# Altium schematic symbol library Electronic Devices_LIB.SchLib: 703 symbols (part 3 of 8)
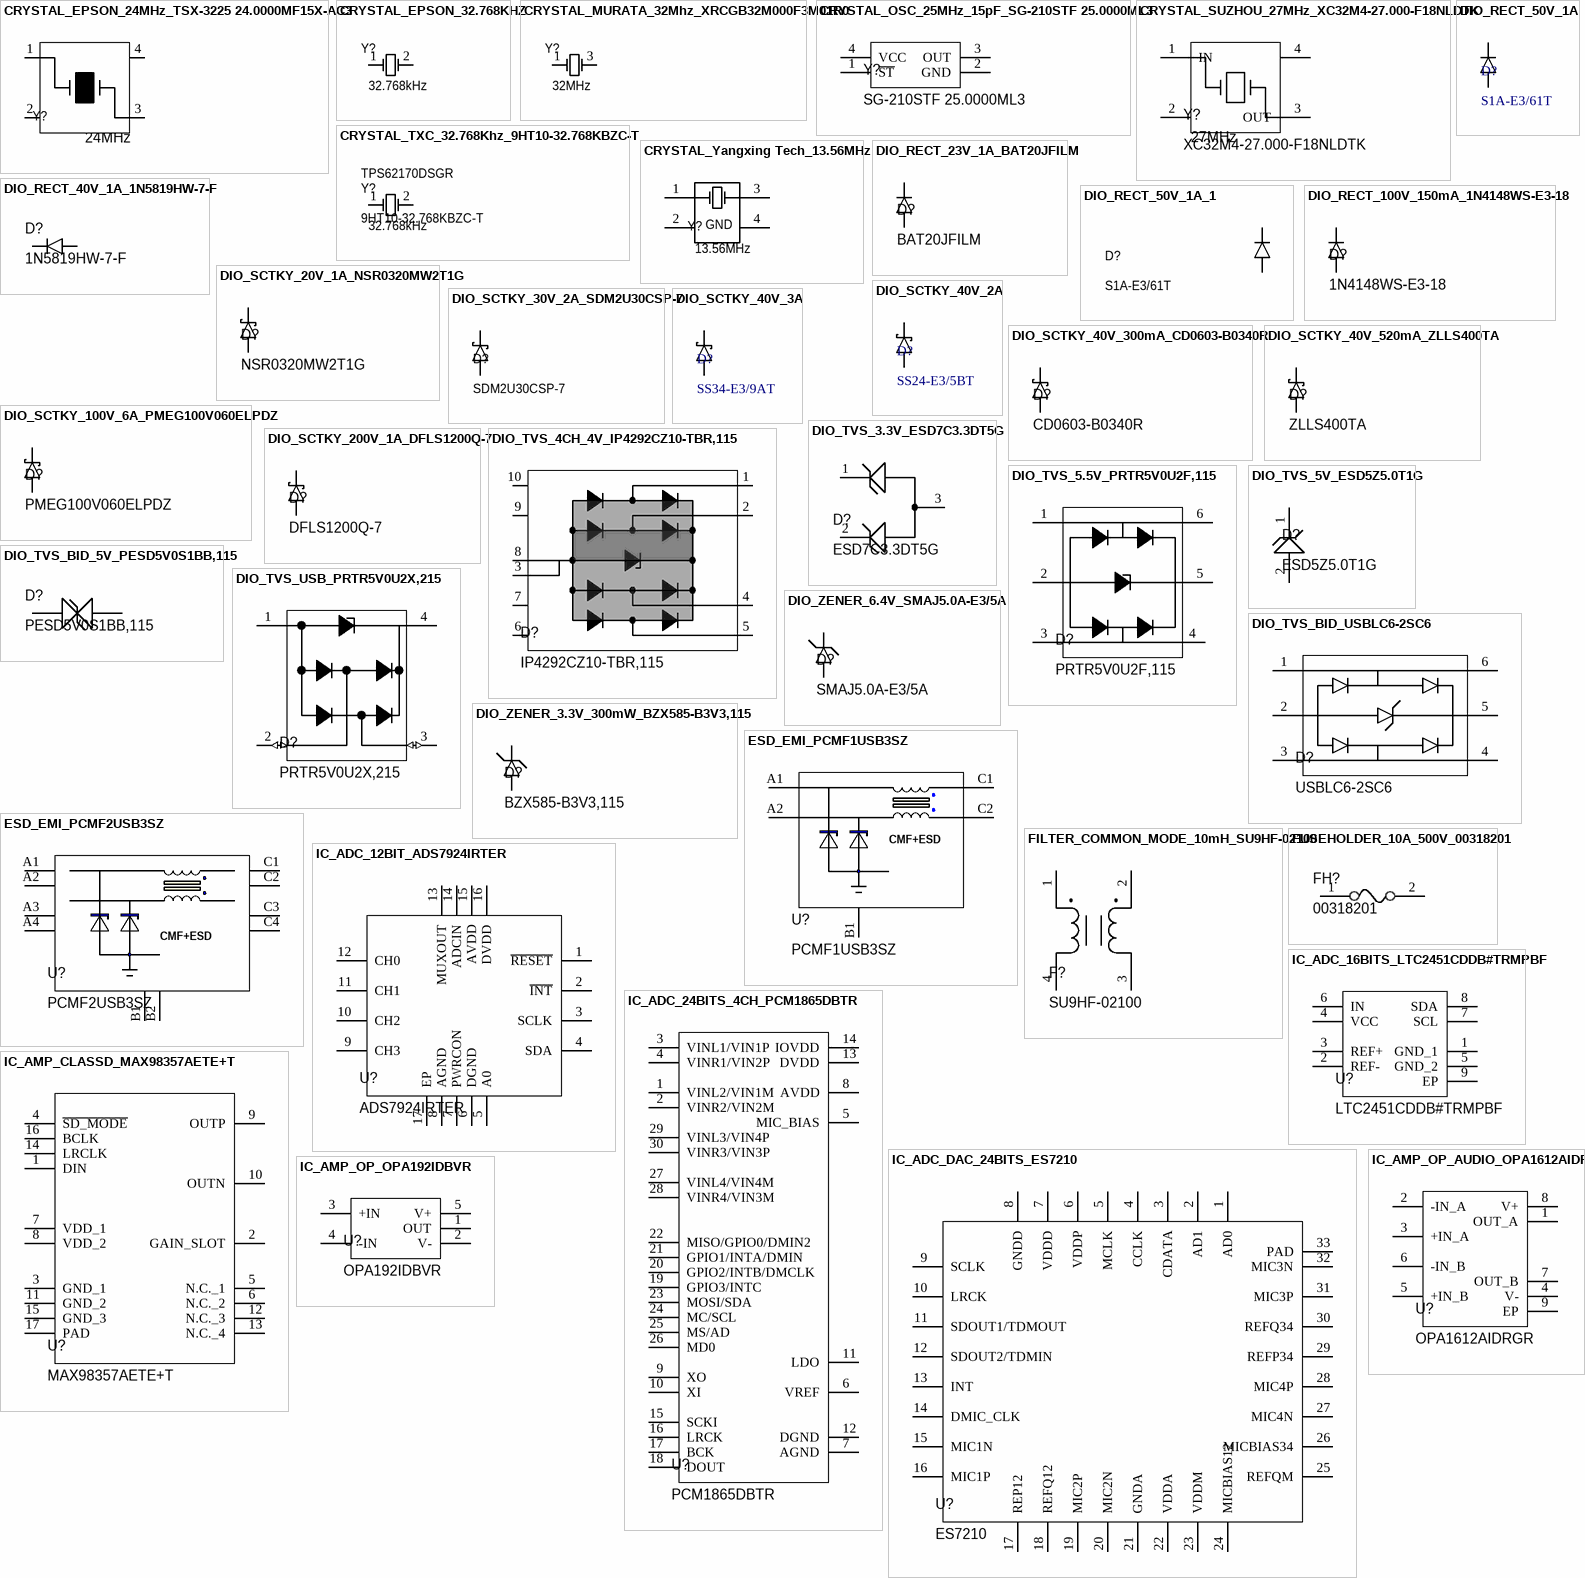
[diagram p38: symbols CRYSTAL_EPSON_24MHz_TSX-3225 24.0000MF15X-AC3 to IC_AMP_OP_OPA192IDBVR]

## IC_AMP_OP_AUDIO_OPA1612AIDRGR
designator U?, comment OPA1612AIDRGR
SoundPlus Audio Operational Amplifier with 1.1nV/√Hz Noise, Low THD and Precision 8-SON -40 to 85; Manufacturer: Texas Instruments; Slew Rate: 27V/µs; Number of Circuits: 2; Gain Bandwidth Product: 40MHz; Input Bias Current: 60nA; Input Offset Voltage (Vos): 100uV; Operating Supply Current: 3.6mA; Output Current per Channel: 55mA; Input Voltage Noise Density: 1.1nV/sqrt Hz; Supplier 1: Digi-Key; Manufacturer Part Number: OPA1612AIDRGR; RoHS: Yes; Category: Amplifiers - Op Amps, Buffer, Instrumentation; Stock 1: 1990; Pricing 1: 1=6.4, 10=5.781, 25=5.5116, 100=4.7857, 250=4.57064, 500=4.16736, 1000=3.62964 (USD); Mount: Surface Mount; Case/Package: SON; Number of Pins: 8; Min Operating Temperature: -40°C; Max Operating Temperature: 85°C; Packaging: Cut Tape; Number of Amplifiers: 2; Package Quantity: 3000; Bandwidth: 40MHz; Number of Channels: 2; Series: SoundPlus™; Reach SVHC Compliant: No; Lead Free: Lead Free; RoHS Compliant: Yes; ComponentLink1URL: https://datasheet.ciiva.com/46439/1850565-46439707.pdf?src-supplier=Element14; ComponentLink1Description: https://datasheet.ciiva.com/46439/1850565-46439707.pdf?src-supplier=Element14; Supplier Part Number 1: 296-38367-1-ND
footprint IC_AMP_OP_SON50P300X300X80-9N-D (8-WFDFN Exposed Pad)
pins: 1 OUT_A, 2 -IN_A, 3 +IN_A, 4 V-, 5 +IN_B, 6 -IN_B, 7 OUT_B, 8 V+, 9 EP

## IC_AMP_OP_OPA192IDBVR
designator U?, comment OPA192IDBVR
General Purpose Amplifier 1 Circuit Rail-to-Rail SOT-23-5; Manufacturer: Texas Instruments; Slew Rate: 20V/µs; Max Supply Voltage: 36V; Min Supply Voltage: 4.5V; Number of Circuits: 1; Gain Bandwidth Product: 10MHz; Input Bias Current: 5pA; Input Offset Voltage (Vos): 5uV; Operating Supply Current: 1mA; Output Current per Channel: 65mA; Supplier 1: Heisener; Manufacturer Part Number: OPA192IDBVR; RoHS: Yes; Category: Amplifiers - Op Amps, Buffer, Instrumentation; Stock 1: 9223; Pricing 1: 1=3.0322 (USD); Case/Package: SOT-23-5; Number of Pins: 5; Min Operating Temperature: -40°C; Max Operating Temperature: 125°C; Packaging: Tape and Reel; Bandwidth: 10MHz; Number of Amplifiers: 1; Number of Channels: 1; Series: e-trim™; Amplifier Type: GENERAL PURPOSE; Reach SVHC Compliant: No; Lead Free: Lead Free; RoHS Compliant: Yes; ComponentLink1URL: http://www.ti.com/general/docs/lit/getliterature.tsp?genericPartNumber=OPA192&&fileType=pdf&src-supplier=Element14; ComponentLink1Description: http://www.ti.com/general/docs/lit/getliterature.tsp?genericPartNumber=OPA192&&fileType=pdf&src-supplier=Element14; ComponentLink2URL: http://www.ti.com/general/docs/lit/getliterature.tsp?genericPartNumber=OPA192&amp;&amp;fileType=pdf&src-supplier=Element14; ComponentLink2Description: http://www.ti.com/general/docs/lit/getliterature.tsp?genericPartNumber=OPA192&amp;&amp;fileType=pdf&src-supplier=Element14; ComponentLink3URL: http://www.ti.com/general/docs/lit/getliterature.tsp?genericPartNumber=OPA192&amp;&amp;fileType=pdf&src-supplier=Farnell; ComponentLink3Description: http://www.ti.com/general/docs/lit/getliterature.tsp?genericPartNumber=OPA192&amp;&amp;fileType=pdf&src-supplier=Farnell; ComponentLink4URL: http://www.ti.com/general/docs/lit/getliterature.tsp?genericPartNumber=OPA192&&fileType=pdf&src-supplier=Farnell; ComponentLink4Description: http://www.ti.com/general/docs/lit/getliterature.tsp?genericPartNumber=OPA192&&fileType=pdf&src-supplier=Farnell; ComponentLink5URL: http://www.ti.com/general/docs/lit/getliterature.tsp?genericPartNumber=OPA2192&&fileType=pdf&src-supplier=Avnet; ComponentLink5Description: http://www.ti.com/general/docs/lit/getliterature.tsp?genericPartNumber=OPA2192&&fileType=pdf&src-supplier=Avnet; ComponentLink6URL: http://www.ti.com/lit/gpn/opa192?src-supplier=Mouser; ComponentLink6Description: http://www.ti.com/lit/gpn/opa192?src-supplier=Mouser; ComponentLink7URL: http://www.ti.com/general/docs/lit/getliterature.tsp?genericPartNumber=OPA192&amp;&amp;fileType=pdf&src-supplier=Newark; ComponentLink7Description: http://www.ti.com/general/docs/lit/getliterature.tsp?genericPartNumber=OPA192&amp;&amp;fileType=pdf&src-supplier=Newark; ComponentLink8URL: http://www.ti.com/lit/ds/symlink/opa192.pdf?src-supplier=Digi-Key; ComponentLink8Description: http://www.ti.com/lit/ds/symlink/opa192.pdf?src-supplier=Digi-Key; Supplier Part Number 1: OPA192IDBVR
footprint IC_AMP_OP_SOT95P280X145-5N (SOT-23-5)
pins: 1 OUT, 2 V- (power), 3 +IN, 4 -IN, 5 V+ (power)

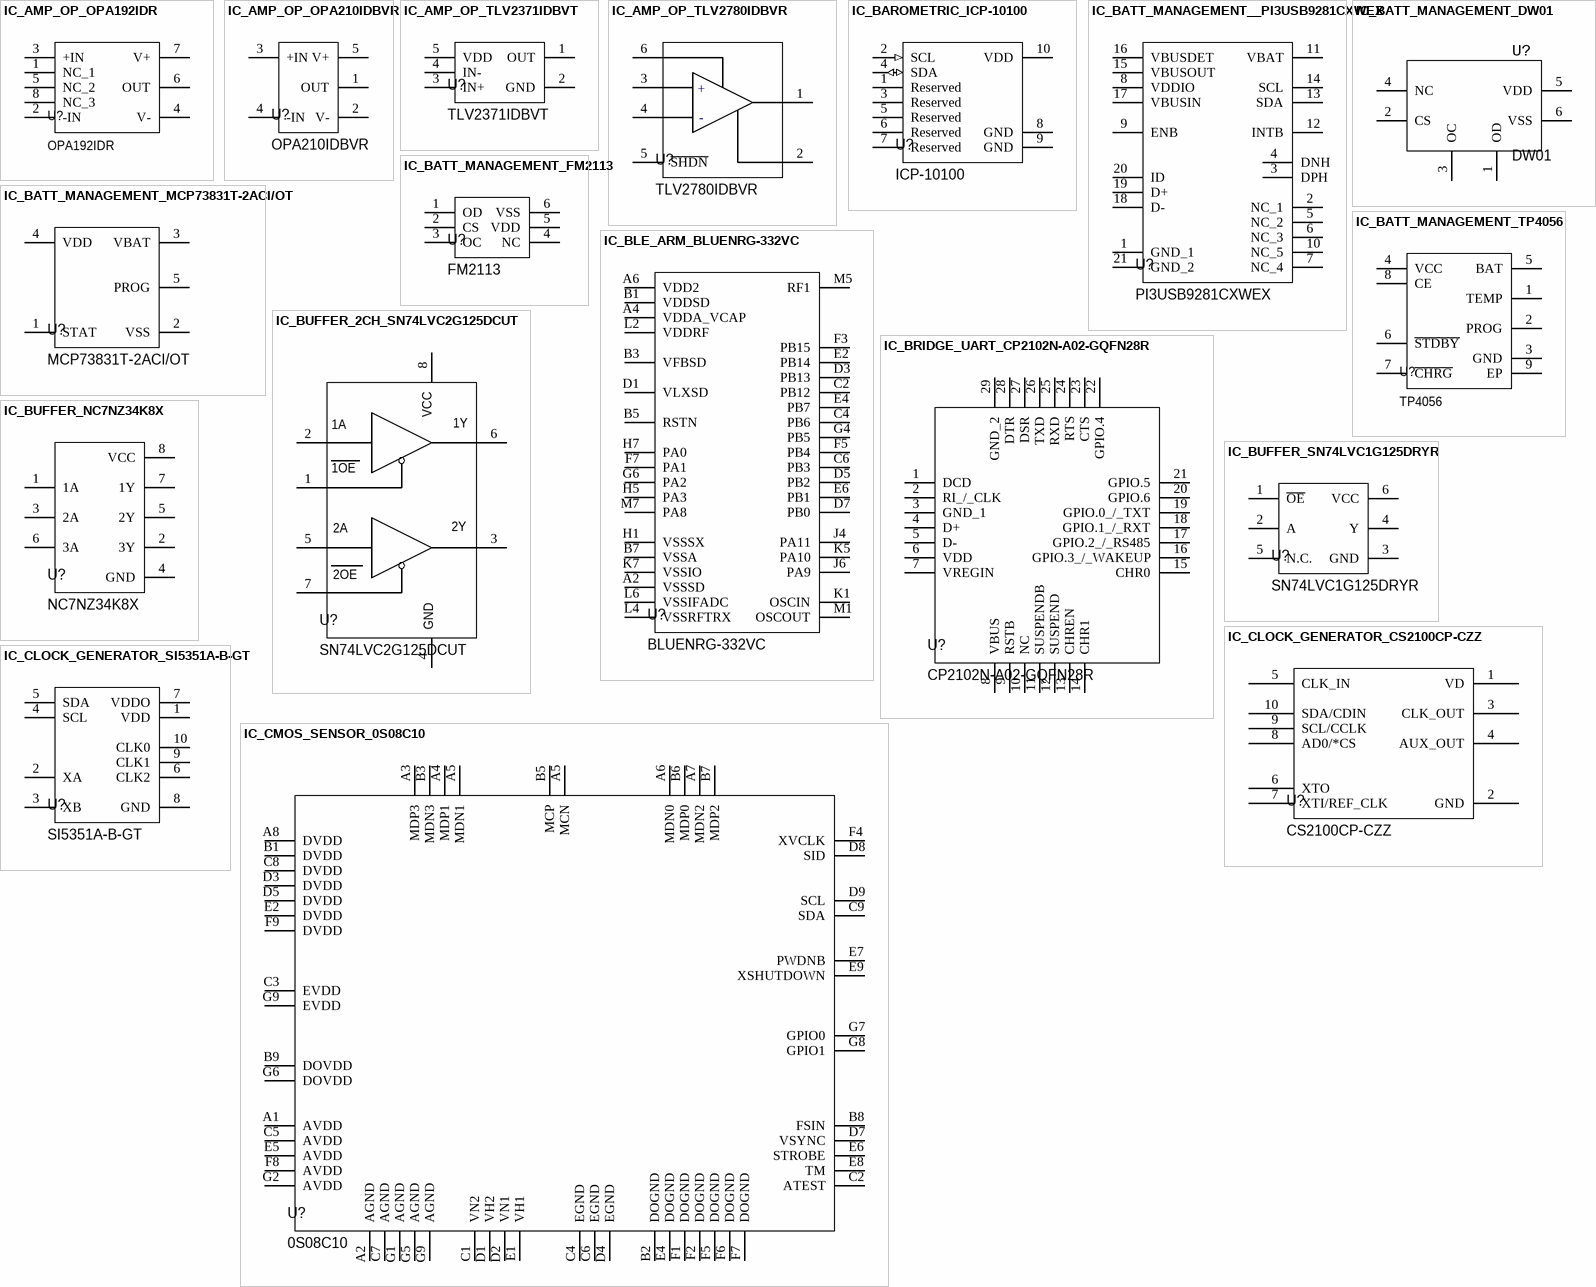
[diagram p7: symbols IC_AMP_OP_OPA192IDR to IC_CMOS_SENSOR_0S08C10]

## IC_AMP_OP_OPA192IDR
designator U?, comment OPA192IDR
IC OPAMP GP 10MHZ RRO 8SOIC; Manufacturer: Texas Instruments; Min Dual Supply Voltage: 2.25V; Max Dual Supply Voltage: 18V; Voltage Gain: 140dB; Slew Rate: 20V/µs; Max Supply Voltage: 36V; Min Supply Voltage: 4.5V; Number of Circuits: 1; Input Bias Current: 5pA; Input Offset Voltage (Vos): 5uV; Operating Supply Current: 1mA; Output Current per Channel: 65mA; Common Mode Rejection Ratio: 100dB; Amplifier Type: GENERAL PURPOSE; Supplier 1: Mouser; Manufacturer Part Number: OPA192IDR; RoHS: Yes; Category: Amplifiers - Op Amps, Buffer, Instrumentation; Stock 1: 7595; Pricing 1: 1=3.14, 10=2.67, 50=2.67, 100=2.31, 250=2.19, 500=1.96, 1000=1.66, 2500=1.56, 5000=1.51, 10000=1.51 (USD); Case/Package: SOIC; Number of Pins: 8; Min Operating Temperature: -40°C; Max Operating Temperature: 125°C; Package Quantity: 2500; Packaging: Tape and Reel; Gain Bandwidth Product: 10MHz; Bandwidth: 10MHz; Number of Amplifiers: 1; Number of Channels: 1; Series: e-trim™; Reach SVHC Compliant: No; Lead Free: Lead Free; RoHS Compliant: Yes; ComponentLink1URL: https://datasheet.ciiva.com/29638/opa192-29638101.pdf?src-supplier=Digi-Key; ComponentLink1Description: https://datasheet.ciiva.com/29638/opa192-29638101.pdf?src-supplier=Digi-Key; ComponentLink2URL: https://datasheet.ciiva.com/29638/opa192-29638102.pdf?src-supplier=Digi-Key; ComponentLink2Description: https://datasheet.ciiva.com/29638/opa192-29638102.pdf?src-supplier=Digi-Key; ComponentLink3URL: https://datasheet.ciiva.com/29638/opa192-29638103.pdf?src-supplier=Digi-Key; ComponentLink3Description: https://datasheet.ciiva.com/29638/opa192-29638103.pdf?src-supplier=Digi-Key; Supplier Part Number 1: 595-OPA192IDR
footprint IC_AMP_OP_SOIC127P600X175-8N (8-SOIC (0.154", 3.90mm Width))
pins: 1 NC_1, 2 -IN, 3 +IN, 4 V-, 5 NC_2, 6 OUT, 7 V+, 8 NC_3

## IC_AMP_OP_OPA210IDBVR
designator U?, comment OPA210IDBVR
2.2-nV/√Hz, low-power, 36-V operational amplifier 5-SOT-23 -40 to 125; Manufacturer: Texas Instruments; Supplier 1: Digi-Key; Manufacturer Part Number: OPA210IDBVR; RoHS: No; Category: Amplifiers - Op Amps, Buffer, Instrumentation; Stock 1: 11070; Pricing 1: 1=3.09, 10=2.776, 25=2.6248, 100=2.2748, 250=2.15812, 500=1.93648, 1000=1.63317 (USD); Supplier Part Number 1: 296-OPA210IDBVRCT-ND
footprint IC_SOT-23-5_SOT95P280X145-5N (SC-74A, SOT-753)
pins: 1 OUT, 2 V-, 3 +IN, 4 -IN, 5 V+

## IC_AMP_OP_TLV2371IDBVT
designator U?, comment TLV2371IDBVT
Single 550-uA/channel, 3MHz, RRIO op amp 5-SOT-23 -40 to 125; Manufacturer: Texas Instruments; Max Supply Voltage: 16V; Min Supply Voltage: 2.7V; Min Dual Supply Voltage: 1.35V; Max Dual Supply Voltage: 8V; Voltage Gain: 110dB; Common Mode Rejection Ratio: 50dB; Output Current: 16mA; Number of Channels: 1; Slew Rate: 2.4V/µs; Max I/O Voltage: 4.5mV; Input Bias Current: 60pA; Operating Supply Current: 750uA; Power Dissipation: 385mW; Power Supply Rejection Ratio (PSRR): 70dB; Amplifier Type: GENERAL PURPOSE; Supply Current: 900uA; Dual Supply Voltage: 5V; Supplier 1: Digikey; Manufacturer Part Number: TLV2371IDBVT; RoHS: Yes; Category: Amplifiers - Op Amps, Buffer, Instrumentation; Stock 1: 25753; Pricing 1: 1=1.65, 10=1.483, 25=1.3988, 100=1.1918 (USD); Case/Package: SOT-23; Number of Pins: 5; Min Operating Temperature: -40°C; Max Operating Temperature: 125°C; Gain Bandwidth Product: 3MHz; Unity Gain Bandwidth Product: 3MHz; Packaging: Tape and Reel; Bandwidth: 3MHz; Operating Supply Voltage: 8V; Package Quantity: 1; Nominal Gain Bandwidth Product: 3MHz; Number of Circuits: 1; Input Offset Voltage (Vos): 4.5mV; Output Current per Channel: 16mA; Number of Elements: 1; Series: -; Number of Amplifiers: 1; Length: 2.9mm; Width: 1.6mm; Height: 1.15mm; Radiation Hardening: No; Lead Free: Lead Free; RoHS Compliant: Yes; Reach SVHC Compliant: No; ComponentLink1URL: https://datasheet.ciiva.com/34301/1096243-34301979.pdf?src-supplier=Jameco; ComponentLink1Description: https://datasheet.ciiva.com/34301/1096243-34301979.pdf?src-supplier=Jameco; ComponentLink2URL: https://datasheet.ciiva.com/1813/tlv2370-1813657.pdf?src-supplier=Digikey; ComponentLink2Description: https://datasheet.ciiva.com/1813/tlv2370-1813657.pdf?src-supplier=Digikey; ComponentLink3URL: https://datasheet.ciiva.com/1813/tlv2370-1813658.pdf?src-supplier=Digikey; ComponentLink3Description: https://datasheet.ciiva.com/1813/tlv2370-1813658.pdf?src-supplier=Digikey; ComponentLink4URL: https://datasheet.ciiva.com/1813/tlv2370-1813659.pdf?src-supplier=Digikey; ComponentLink4Description: https://datasheet.ciiva.com/1813/tlv2370-1813659.pdf?src-supplier=Digikey; ComponentLink5URL: https://datasheet.ciiva.com/2974/slos270d-2974406.pdf?src-supplier=Avnet; ComponentLink5Description: https://datasheet.ciiva.com/2974/slos270d-2974406.pdf?src-supplier=Avnet; ComponentLink6URL: https://datasheet.ciiva.com/2974/slos270d-2974407.pdf?src-supplier=Avnet; ComponentLink6Description: https://datasheet.ciiva.com/2974/slos270d-2974407.pdf?src-supplier=Avnet; ComponentLink7URL: https://datasheet.ciiva.com/22707/1877122-22707949.pdf?src-supplier=Element14; ComponentLink7Description: https://datasheet.ciiva.com/22707/1877122-22707949.pdf?src-supplier=Element14; ComponentLink8URL: https://datasheet.ciiva.com/46386/1877122-46386527.pdf?src-supplier=Element14; ComponentLink8Description: https://datasheet.ciiva.com/46386/1877122-46386527.pdf?src-supplier=Element14; ComponentLink9URL: https://datasheet.ciiva.com/7848/1877122-7848285.pdf?src-supplier=Element14; ComponentLink9Description: https://datasheet.ciiva.com/7848/1877122-7848285.pdf?src-supplier=Element14; Supplier Part Number 1: 296-26785-6-ND
footprint IC_AMP_OP_SOT95P280X145-5N (SOT-23-5)
pins: 1 OUT, 2 GND (power), 3 IN+, 4 IN-, 5 VDD (power)

## IC_AMP_OP_TLV2780IDBVR
designator U?, comment TLV2780IDBVR
Op Amp Single High Speed Amplifier R-R I/O ±1.8V/3.6V 6-Pin SOT-23 T/R; Manufacturer: Texas Instruments; Unity Gain Bandwidth Product: 8MHz; Min Supply Voltage: 1.8V; Max Supply Voltage: 3.6V; Min Dual Supply Voltage: 900mV; Voltage Gain: 120dB; Output Current: 23mA; Common Mode Rejection Ratio: 50dB; Number of Channels: 1; Slew Rate: 4.3V/µs; Max I/O Voltage: 3mV; Input Bias Current: 15pA; Operating Supply Current: 650uA; Power Dissipation: 425mW; Supply Current: 770uA; Amplifier Type: GENERAL PURPOSE; Supplier 1: Mouser; Manufacturer Part Number: TLV2780IDBVR; RoHS: Yes; Category: Amplifiers - Op Amps, Buffer, Instrumentation; Stock 1: 4329; Pricing 1: 1=2.27, 10=1.95, 50=1.95, 100=1.68, 250=1.58, 500=1.48, 1000=1.23, 3000=1.14, 6000=1.07, 9000=1.05, 10000=1.07 (USD); Case/Package: SOT-23-6; Number of Pins: 6; Min Operating Temperature: -40°C; Max Operating Temperature: 125°C; Max Dual Supply Voltage: 1.8V; Packaging: Tape and Reel; Package Quantity: 1; Nominal Gain Bandwidth Product: 8MHz; Input Offset Voltage (Vos): 3mV; Gain Bandwidth Product: 8MHz; Number of Circuits: 1; Output Current per Channel: 23mA; Number of Elements: 1; Bandwidth: 8MHz; Series: -; Radiation Hardening: No; Lead Free: Lead Free; RoHS Compliant: Yes; ComponentLink1URL: https://datasheet.ciiva.com/1798/tlv2782a-1798923.pdf?src-supplier=Digikey; ComponentLink1Description: https://datasheet.ciiva.com/1798/tlv2782a-1798923.pdf?src-supplier=Digikey; ComponentLink2URL: https://datasheet.ciiva.com/1798/tlv2782a-1798924.pdf?src-supplier=Digikey; ComponentLink2Description: https://datasheet.ciiva.com/1798/tlv2782a-1798924.pdf?src-supplier=Digikey; ComponentLink3URL: https://datasheet.ciiva.com/1798/tlv2780-1798925.pdf?src-supplier=Digikey; ComponentLink3Description: https://datasheet.ciiva.com/1798/tlv2780-1798925.pdf?src-supplier=Digikey; ComponentLink4URL: https://datasheet.ciiva.com/14460/slos245e-14460553.pdf?src-supplier=Avnet; ComponentLink4Description: https://datasheet.ciiva.com/14460/slos245e-14460553.pdf?src-supplier=Avnet; ComponentLink5URL: https://datasheet.ciiva.com/48706/001072368-da-01-en-ic-opamp-gp-r-tlv2780idbvr-sot-23-6-tid-48706699.pdf?src-supplier=Conrad; ComponentLink5Description: https://datasheet.ciiva.com/48706/001072368-da-01-en-ic-opamp-gp-r-tlv2780idbvr-sot-23-6-tid-48706699.pdf?src-supplier=Conrad; Supplier Part Number 1: 595-TLV2780IDBVR
footprint Texas_Instruments_DBV0006A_IPC_A
pins: 1 OUT (hiz), 2 GND (power), 3 IN+ (hiz), 4 IN- (hiz), 5 ~{SHDN}, 6 VDD (power)

## IC_BAROMETRIC_ICP-10100
designator U?, comment ICP-10100
Barometric Pressure and Temperature Sensor Digital Output 1.8V 10-Pin LGA T/R; Manufacturer: TDK InvenSense; Output Type: I2C; Pressure Type: Differential; Operating Pressure: 15.95PSI; Port Style: No Port; Supplier 1: Digikey; Manufacturer Part Number: ICP-10100; RoHS: Yes; Category: Pressure Sensors; Stock 1: 17254; Pricing 1: 1=3.67, 10=2.75, 25=2.444, 50=2.322, 100=2.2609, 500=1.89426, 1000=1.77204, 5000=1.64984 (USD); Case/Package: LGA; Number of Pins: 10; Min Operating Temperature: -40°C; Max Operating Temperature: 85°C; Series: -; Packaging: Cut Tape; Termination: SMD/SMT; RoHS Compliant: Yes; ComponentLink1URL: http://www.farnell.com/datasheets/2632663.pdf?src-supplier=Farnell; ComponentLink1Description: http://www.farnell.com/datasheets/2632663.pdf?src-supplier=Farnell; ComponentLink2URL: http://www.invensense.com/wp-content/uploads/2018/01/DS-000186-ICP-101xx-v1.0.pdf?src-supplier=Digikey; ComponentLink2Description: http://www.invensense.com/wp-content/uploads/2018/01/DS-000186-ICP-101xx-v1.0.pdf?src-supplier=Digikey; ComponentLink3URL: http://www.invensense.com/wp-content/uploads/2018/01/DS-000186-ICP-101xx-v1.2.pdf?ref_disty=digikey&src-supplier=Digikey; ComponentLink3Description: http://www.invensense.com/wp-content/uploads/2018/01/DS-000186-ICP-101xx-v1.2.pdf?ref_disty=digikey&src-supplier=Digikey; Supplier Part Number 1: 1428-1135-1-ND
footprint IC_IMU_TDK_InvenSense_0_IPC_A (QFN 3.0x3.0x0.9)
pins: 1 Reserved, 2 SCL (in), 3 Reserved, 4 SDA (io), 5 Reserved, 6 Reserved, 7 Reserved, 8 GND (power), 9 GND (power), 10 VDD

## IC_BATT_MANAGEMENT__PI3USB9281CXWEX
designator U?, comment PI3USB9281CXWEX
Battery Charger Li-Ion 30mA 20-Pin UQFN EP T/R; Manufacturer: Diodes; Supplier 1: Digi-Key; Manufacturer Part Number: PI3USB9281CXWEX; RoHS: Yes; Category: Power Management ICs; Stock 1: 26042; Pricing 1: 1=1.64, 10=1.472, 25=1.3888, 100=1.1832, 250=1.111, 500=0.97212, 1000=0.80548, 2500=0.74992 (USD); Mount: Surface Mount; Min Operating Temperature: -40°C; Max Operating Temperature: 85°C; Packaging: Cut Tape; Series: -; RoHS Compliant: Yes; ComponentLink1URL: https://www.diodes.com/assets/Datasheets/PI3USB9281C.pdf?src-supplier=Digi-Key; ComponentLink1Description: https://www.diodes.com/assets/Datasheets/PI3USB9281C.pdf?src-supplier=Digi-Key; Supplier Part Number 1: PI3USB9281CXWEXDICT-ND
footprint IC_BATT_MANG_QFN50P300X400X55-21N-D (20-Lead UQFN)
pins: 1 GND_1, 2 NC_1, 3 DPH, 4 DNH, 5 NC_2, 6 NC_3, 7 NC_4, 8 VDDIO, 9 ENB, 10 NC_5, 11 VBAT, 12 INTB, 13 SDA, 14 SCL, 15 VBUSOUT, 16 VBUSDET, 17 VBUSIN, 18 D-, 19 D+, 20 ID, 21 GND_2

## IC_BATT_MANAGEMENT_DW01
designator U?, comment DW01
SOT-23-6 Battery Management ICs ROHS; Manufacturer: JSMSEMI; Supplier: LCSC; Manufacturer part number: DW01; ComponentLink1Description: Supplier; ComponentLink1URL: https://www.lcsc.com/product-detail/Battery-Management-ICs_JSMSEMI-DW01_C917079.html
footprint IC_SOT23-6_RF_SOT95P280X135-6N (SOT23, 6-Leads, Body 2.92x2.80mm, Pitch 0.95mm, IPC Medium Density)
pins: 1 OD, 2 CS, 3 OC, 4 NC, 5 VDD, 6 VSS

## IC_BATT_MANAGEMENT_FM2113
designator U?, comment FM2113
SOT-23-6 Battery Management ICs ROHS; Manufacturer: Shenzhen Fuman Elec; Supplier: LCSC; Manufacturer part number: FM2113; ComponentLink1Description: Supplier; ComponentLink1URL: https://www.lcsc.com/product-detail/Battery-Management-ICs_Shenzhen-Fuman-Elec-FM2113_C2832124.html
footprint IC_SOT23-6_RF_SOT95P280X135-6N (SOT23, 6-Leads, Body 2.92x2.80mm, Pitch 0.95mm, IPC Medium Density)
pins: 1 OD, 2 CS, 3 OC, 4 NC, 5 VDD, 6 VSS

## IC_BATT_MANAGEMENT_MCP73831T-2ACI/OT
designator U?, comment MCP73831T-2ACI/OT
MCP73831 Series Single-Cell Li-Ion/Li-Polymer Battery Charge Controller SOT-23-5; Manufacturer: Microchip; Number of Cells: 1; Output Voltage: 4.2V; Max Supply Voltage: 6V; Min Supply Voltage: 3.75V; Output Current: 500mA; Max Output Voltage: 4.5V; Min Output Voltage: 4.168V; Fault Protection: Over Voltage; Max Power Dissipation: 1.54W; Drain to Source Resistance: 350mR; Voltage Rating: 4.534V; Supplier 1: Mouser; Manufacturer Part Number: MCP73831T-2ACI/OT; RoHS: Yes; Category: Battery Management; Stock 1: 310170; Pricing 1: 1=0.73, 10=0.702, 25=0.63, 50=0.63, 100=0.613, 1000=0.613, 3000=0.612, 10000=0.612 (USD); Mount: Surface Mount; Case/Package: SOT-23; Number of Pins: 5; Weight: 0.00709oz; Min Operating Temperature: -40°C; Max Operating Temperature: 85°C; Packaging: Tape and Reel; Max Charge Current: 500mA; Series: -; Battery Pack Voltage: 4.2V; Max Input Voltage: 6V; Number of Outputs: 1; Number of Channels: 1; Termination: SMD/SMT; Length: 3.1mm; Width: 1.8mm; Height: 1.3mm; Radiation Hardening: No; Reach SVHC Compliant: No; Lead Free: Lead Free; RoHS Compliant: Yes; ComponentLink1URL: https://datasheet.ciiva.com/22828/0900766b80d2b53a-22828876.pdf?src-supplier=Rs; ComponentLink1Description: https://datasheet.ciiva.com/22828/0900766b80d2b53a-22828876.pdf?src-supplier=Rs; ComponentLink2URL: https://datasheet.ciiva.com/26344/651521-da-01-en-contr-mcp73831t-2aci-ot-sot-23-5-mcp-26344458.pdf?src-supplier=Conrad; ComponentLink2Description: https://datasheet.ciiva.com/26344/651521-da-01-en-contr-mcp73831t-2aci-ot-sot-23-5-mcp-26344458.pdf?src-supplier=Conrad; ComponentLink3URL: https://datasheet.ciiva.com/1137/630369-1137803.pdf?src-supplier=Element14; ComponentLink3Description: https://datasheet.ciiva.com/1137/630369-1137803.pdf?src-supplier=Element14; ComponentLink4URL: https://datasheet.ciiva.com/16286/filehandler-aspxddocname-en025112-16286957.pdf?src-supplier=Future+Electronics; ComponentLink4Description: https://datasheet.ciiva.com/16286/filehandler-aspxddocname-en025112-16286957.pdf?src-supplier=Future+Electronics; ComponentLink5URL: https://datasheet.ciiva.com/28626/630369-28626439.pdf?src-supplier=Element14; ComponentLink5Description: https://datasheet.ciiva.com/28626/630369-28626439.pdf?src-supplier=Element14; ComponentLink6URL: https://datasheet.ciiva.com/46385/630369-46385324.pdf?src-supplier=Element14; ComponentLink6Description: https://datasheet.ciiva.com/46385/630369-46385324.pdf?src-supplier=Element14; ComponentLink7URL: https://datasheet.ciiva.com/1144/630369-1144461.pdf?src-supplier=Newark; ComponentLink7Description: https://datasheet.ciiva.com/1144/630369-1144461.pdf?src-supplier=Newark; ComponentLink8URL: https://datasheet.ciiva.com/3213/21984e-3213404.pdf?src-supplier=Avnet; ComponentLink8Description: https://datasheet.ciiva.com/3213/21984e-3213404.pdf?src-supplier=Avnet; ComponentLink9URL: https://datasheet.ciiva.com/1931/21984e-1931954.pdf?src-supplier=Digikey; ComponentLink9Description: https://datasheet.ciiva.com/1931/21984e-1931954.pdf?src-supplier=Digikey; ComponentLink10URL: https://datasheet.ciiva.com/1931/21984e-1931955.pdf?src-supplier=Digikey; ComponentLink10Description: https://datasheet.ciiva.com/1931/21984e-1931955.pdf?src-supplier=Digikey; ComponentLink11URL: https://datasheet.ciiva.com/1931/21984e-1931953.pdf?src-supplier=Digikey; ComponentLink11Description: https://datasheet.ciiva.com/1931/21984e-1931953.pdf?src-supplier=Digikey; Supplier Part Number 1: 579-MCP73831T-2ACIOT